# Altium footprint library Capacitors.PcbLib: 31 footprints (part 2 of 2)
Each footprint in its own frame and in the unit in brackets; x right, y up, seen from the top. Pads: shape width x height; smd on the part's side, far side on the other; paste and mask are expansions set on the pad; w line width, h text height; cw(c..) or ccw(c..) is an arc to the next point about the centre after c.
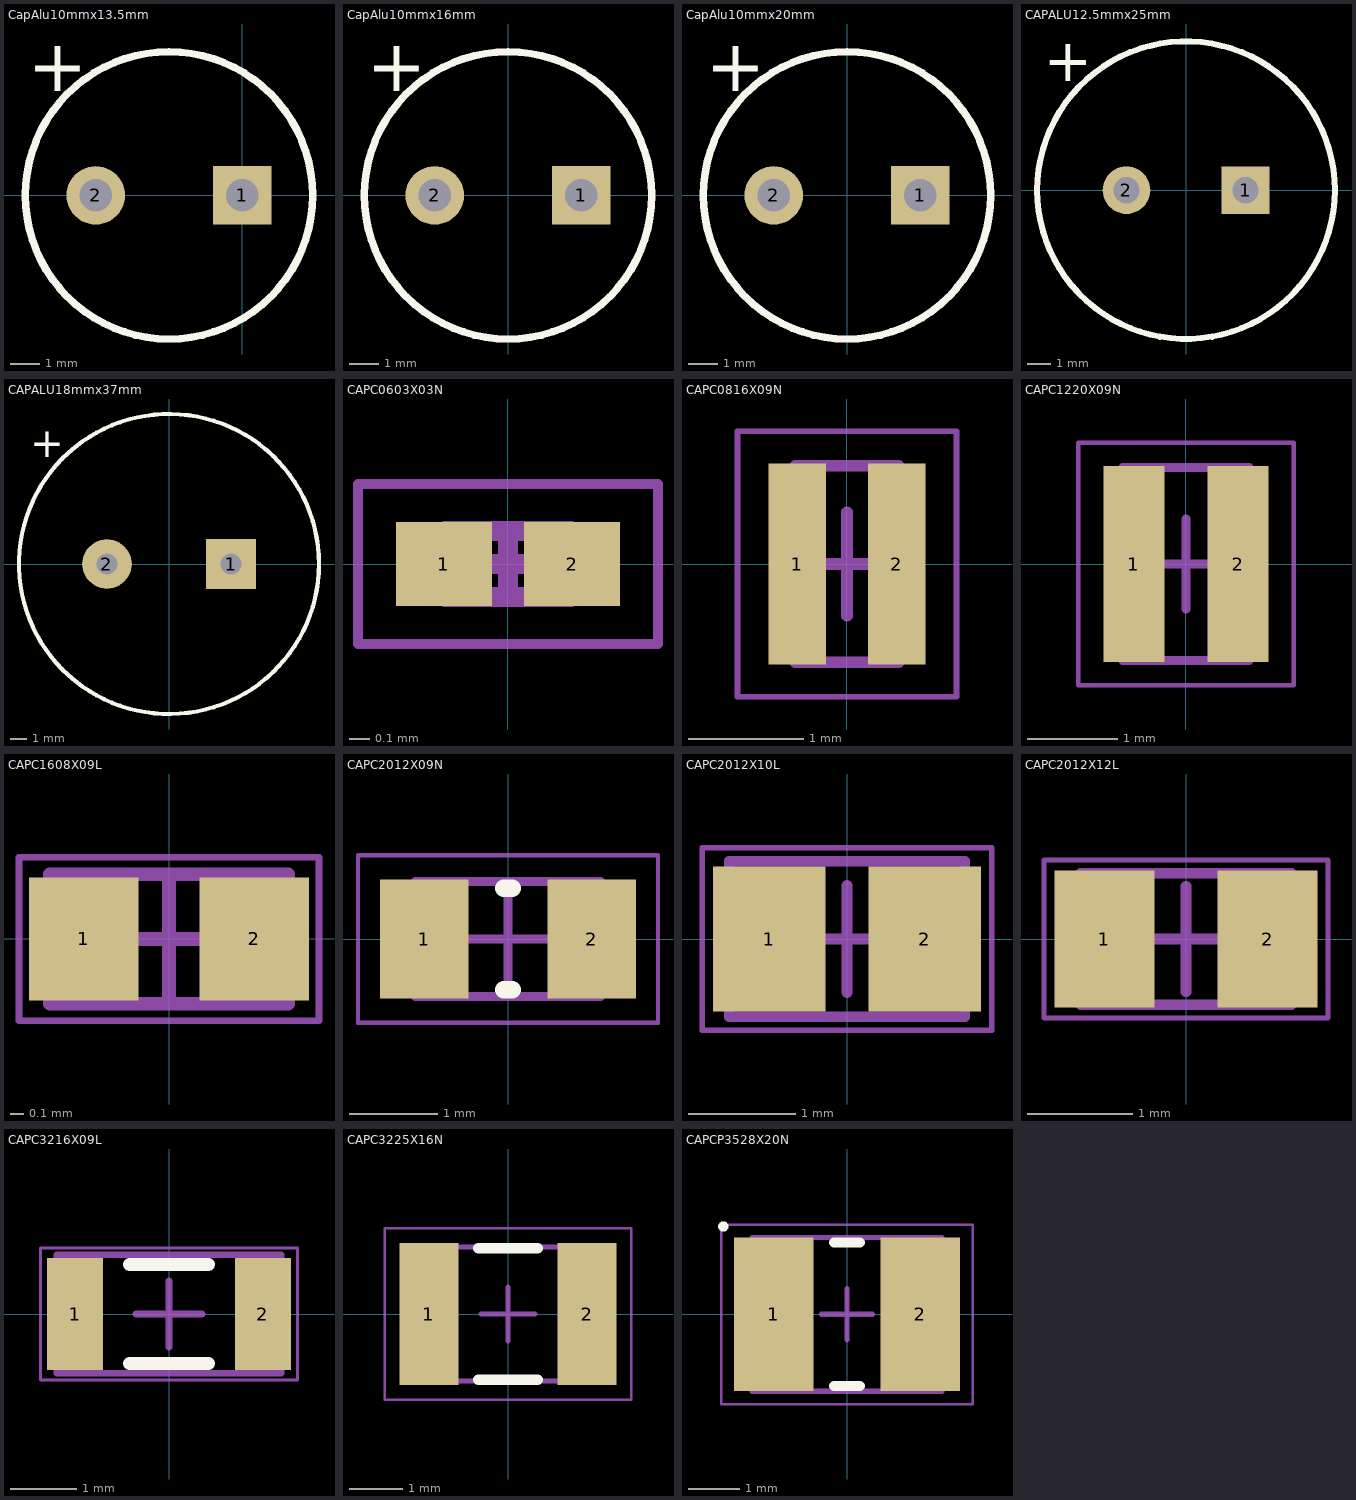
[diagram p1: the footprints below, top view; thin cyan lines are the x and y axes]

## CapAlu10mmx13.5mm [mm] "Capacitor Aluminum 10mm OD"
height 13.5
pads (2):
  rect 2x2 hole 1.1: 1(0,0)
  round 2 hole 1.1: 2(-5,0)
Top Overlay:
  circle w0.254: c-2.5,0 r4.9
  text "+" at -7.326,3.556 h1.78
3D body "User Library-CapAluRadial_D100H125.STEP": height 14, standoff -3, extent -7.79,-5.249 2.704,5.249

## CapAlu10mmx16mm [mm] "Capacitor Aluminum 10mm OD"
height 16
pads (2):
  rect 2x2 hole 1.1: 1(2.5,0)
  round 2 hole 1.1: 2(-2.5,0)
Top Overlay:
  circle w0.254: c0,0 r4.9
  text "+" at -4.826,3.556 h1.78
3D body "User Library-Cap-EL(10x16-5)T.STEP": height 16.5, standoff -2.5, extent -5.001,-4.955 5.001,5.031

## CapAlu10mmx20mm [mm] "Capacitor Aluminum 10mm OD"
height 20
pads (2):
  rect 2x2 hole 1.1: 1(2.5,0)
  round 2 hole 1.1: 2(-2.5,0)
Top Overlay:
  circle w0.254: c0,0 r4.9
  text "+" at -4.826,3.556 h1.78
3D body "User Library-Cap-EL(10x20-5).STEP": height 20, standoff -3.3, extent -5.001,-4.953 5.001,5.038

## CAPALU12.5mmx25mm [mm] "Capacitor Aluminum 12.5mm"
height 25
pads (2):
  rect 2x2 hole 1.1: 1(2.5,0)
  round 2 hole 1.1: 2(-2.5,0)
Top Overlay:
  circle w0.254: c0,0 r6.25
  text "+" at -5.969,4.572 h1.78
3D body "User Library-Cap-EL(12_5x25-5)T.step": height 25.5, standoff -3.5, extent -6.25,-6.241 6.252,6.242

## CAPALU18mmx37mm [mm] "Capacitor Aluminum 18mm"
height 37
pads (2):
  rect 3x3 hole 1.25: 1(3.75,0)
  round 3 hole 1.25: 2(-3.75,0)
Top Overlay:
  circle w0.254: c0,0 r9.067
  text "+" at -8.373,6.45 h1.78
3D body "User Library-CapAluRadial_D180H355.STEP": height 39, standoff -1.5, extent -9.25,-9.25 9.25,9.25

## CAPC0603X03N [mm] "Chip Capacitor, 2-Leads, Body 0.60x0.30mm, IPC Medium Density"
height 0.33
pads (2):
  rect 0.48x0.42 smd: 1(-0.32,0) 2(0.32,0)
Mechanical 13:
  lines w0.1: -0.315,-0.165 0.315,-0.165 0.315,0.165 -0.315,0.165 -0.315,-0.165
Mechanical 15:
  lines w0.05: -0.75,-0.4 0.75,-0.4 0.75,0.4 -0.75,0.4 -0.75,-0.4
  lines w0.1: -0.165,0 0.165,0 ; 0,-0.165 0,0.165
3D body: height 0.33, standoff 0, extent 0.165,-0.165 0.315,0.165
3D body: height 0.33, standoff 0, extent -0.315,-0.165 -0.165,0.165
3D body: height 0.33, standoff 0, extent -0.165,-0.165 0.165,0.165

## CAPC0816X09N [mm] "Chip Capacitor, 2-Leads, Body 0.80x1.60mm, IPC Medium Density"
height 0.9
pads (2):
  rect 0.5x1.74 smd: 1(-0.43,0) 2(0.43,0)
Mechanical 13:
  lines w0.1: -0.45,-0.85 0.45,-0.85 0.45,0.85 -0.45,0.85 -0.45,-0.85
Mechanical 15:
  lines w0.05: -0.95,-1.15 0.95,-1.15 0.95,1.15 -0.95,1.15 -0.95,-1.15
  lines w0.1: -0.45,0 0.45,0 ; 0,-0.45 0,0.45
3D body: height 0.9, standoff 0, extent 0.32,-0.85 0.45,0.85
3D body: height 0.9, standoff 0, extent -0.45,-0.85 -0.32,0.85
3D body: height 0.9, standoff 0, extent -0.32,-0.85 0.32,0.85

## CAPC1220X09N [mm] "Chip Capacitor, 2-Leads, Body 1.25x2.00mm, IPC Medium Density"
height 0.95
pads (2):
  rect 0.68x2.18 smd: 1(-0.58,0) 2(0.58,0)
Mechanical 13:
  lines w0.1: -0.7,-1.075 -0.7,1.075 0.7,1.075 0.7,-1.075 -0.7,-1.075
Mechanical 15:
  lines w0.05: -1.2,-1.35 -1.2,1.35 1.2,1.35 1.2,-1.35 -1.2,-1.35
  lines w0.1: -0.5,0 0.5,0 ; 0,-0.5 0,0.5
3D body: height 0.95, standoff 0, extent -0.5,-1.075 0.5,1.075
3D body: height 0.95, standoff 0, extent -0.7,-1.075 -0.5,1.075
3D body: height 0.95, standoff 0, extent 0.5,-1.075 0.7,1.075

## CAPC1608X09L [mm] "Chip Capacitor, 2-Leads, Body 1.60x0.80mm, IPC High Density"
height 0.9
pads (2):
  rect 0.8x0.9 smd: 1(-0.625,0) 2(0.625,0)
Mechanical 13:
  lines w0.1: -0.875,-0.475 -0.875,0.475 0.875,0.475 0.875,-0.475 -0.875,-0.475
Mechanical 15:
  lines w0.05: -1.1,-0.6 -1.1,0.6 1.1,0.6 1.1,-0.6 -1.1,-0.6
  lines w0.1: -0.475,0 0.475,0 ; 0,-0.475 0,0.475
3D body "CAPC1608X09L.step": height 0.9, standoff 0, extent -0.875,-0.475 0.875,0.475

## CAPC2012X09N [mm] "Chip Capacitor, 2-Leads, Body 2.00x1.20mm, IPC Medium Density"
height 0.95
pads (2):
  rect 1x1.35 smd: 1(-0.95,0) 2(0.95,0)
Top Overlay:
  lines w0.2: -0.05,-0.575 0.05,-0.575 ; -0.05,0.575 0.05,0.575
Mechanical 13:
  lines w0.1: -1.05,-0.65 -1.05,0.65 1.05,0.65 1.05,-0.65 -1.05,-0.65
Mechanical 15:
  lines w0.05: -1.7,-0.95 -1.7,0.95 1.7,0.95 1.7,-0.95 -1.7,-0.95
  lines w0.1: -0.5,0 0.5,0 ; 0,-0.5 0,0.5
3D body "CAPC2012X09N.step": height 0.95, standoff 0, extent -1.05,-0.65 1.05,0.65

## CAPC2012X10L [mm] "Chip Capacitor, 2-Leads, Body 2.00x1.25mm, IPC High Density"
height 1
pads (2):
  rect 1.05x1.35 smd: 1(-0.725,0) 2(0.725,0)
Mechanical 13:
  lines w0.1: -1.1,-0.725 1.1,-0.725 1.1,0.725 -1.1,0.725 -1.1,-0.725
Mechanical 15:
  lines w0.05: -1.35,-0.85 1.35,-0.85 1.35,0.85 -1.35,0.85 -1.35,-0.85
  lines w0.1: -0.5,0 0.5,0 ; 0,-0.5 0,0.5
3D body "CAPC2012X10L.step": height 1, standoff 0, extent -1.1,-0.725 1.1,0.725

## CAPC2012X12L [mm] "Chip Capacitor, 2-Leads, Body 2.00x1.25mm, IPC High Density"
height 1.25
pads (2):
  rect 0.95x1.3 smd: 1(-0.775,0) 2(0.775,0)
Mechanical 13:
  lines w0.1: -1,-0.625 -1,0.625 1,0.625 1,-0.625 -1,-0.625
Mechanical 15:
  lines w0.05: -1.35,-0.75 -1.35,0.75 1.35,0.75 1.35,-0.75 -1.35,-0.75
  lines w0.1: -0.5,0 0.5,0 ; 0,-0.5 0,0.5
3D body: height 1.25, standoff 0, extent -0.55,-0.625 0.55,0.625
3D body: height 1.25, standoff 0, extent -1,-0.625 -0.55,0.625
3D body: height 1.25, standoff 0, extent 0.55,-0.625 1,0.625

## CAPC3216X09L [mm] "Chip Capacitor, 2-Leads, Body 3.20x1.60mm, IPC High Density"
height 0.95
pads (2):
  rect 0.85x1.7 smd: 1(-1.425,0) 2(1.425,0)
Top Overlay:
  lines w0.2: -0.6,-0.75 0.6,-0.75 ; -0.6,0.75 0.6,0.75
Mechanical 13:
  lines w0.1: -1.7,-0.9 1.7,-0.9 1.7,0.9 -1.7,0.9 -1.7,-0.9
Mechanical 15:
  lines w0.05: -1.95,-1 1.95,-1 1.95,1 -1.95,1 -1.95,-1
  lines w0.1: -0.5,0 0.5,0 ; 0,-0.5 0,0.5
3D body "CAPC3216X09L.step": height 0.95, standoff 0, extent -1.7,-0.9 1.7,0.9

## CAPC3225X16N [mm] "Chip Capacitor, 2-Leads, Body 3.20x2.50mm, IPC Medium Density"
height 1.6
pads (2):
  rect 1.1x2.65 smd: 1(-1.475,0) 2(1.475,0)
Top Overlay:
  lines w0.2: -0.55,-1.225 0.55,-1.225 ; -0.55,1.225 0.55,1.225
Mechanical 13:
  lines w0.1: -1.6,-1.25 1.6,-1.25 1.6,1.25 -1.6,1.25 -1.6,-1.25
Mechanical 15:
  lines w0.05: -2.3,-1.6 2.3,-1.6 2.3,1.6 -2.3,1.6 -2.3,-1.6
  lines w0.1: -0.5,0 0.5,0 ; 0,-0.5 0,0.5
3D body "User Library-cap_1210_lowprofile.STEP": height 1.3, standoff 0, extent -1.6,-1.25 1.6,1.25

## CAPCP3528X20N [mm] "Chip Capacitor, 2-Leads, Body 3.50x2.80mm, IPC Medium Density"
height 2
pads (2):
  rect 1.55x3 smd: 1(-1.425,0) 2(1.425,0)
Top Overlay:
  circle w0.1: c-2.412,1.712 r0.05
  lines w0.2: -0.25,-1.4 0.25,-1.4 ; -0.25,1.4 0.25,1.4
Mechanical 13:
  lines w0.1: -1.85,-1.5 1.85,-1.5 1.85,1.5 -1.85,1.5 -1.85,-1.5
Mechanical 15:
  lines w0.05: -2.45,-1.75 2.45,-1.75 2.45,1.75 -2.45,1.75 -2.45,-1.75
  lines w0.1: -0.5,0 0.5,0 ; 0,-0.5 0,0.5
3D body "B_case.stp": height 1.96, standoff -0.07, extent -1.826,-1.473 1.874,1.457